# Altium integrated library Supernova Connectors.IntLib: 270 symbols (part 2 of 2)
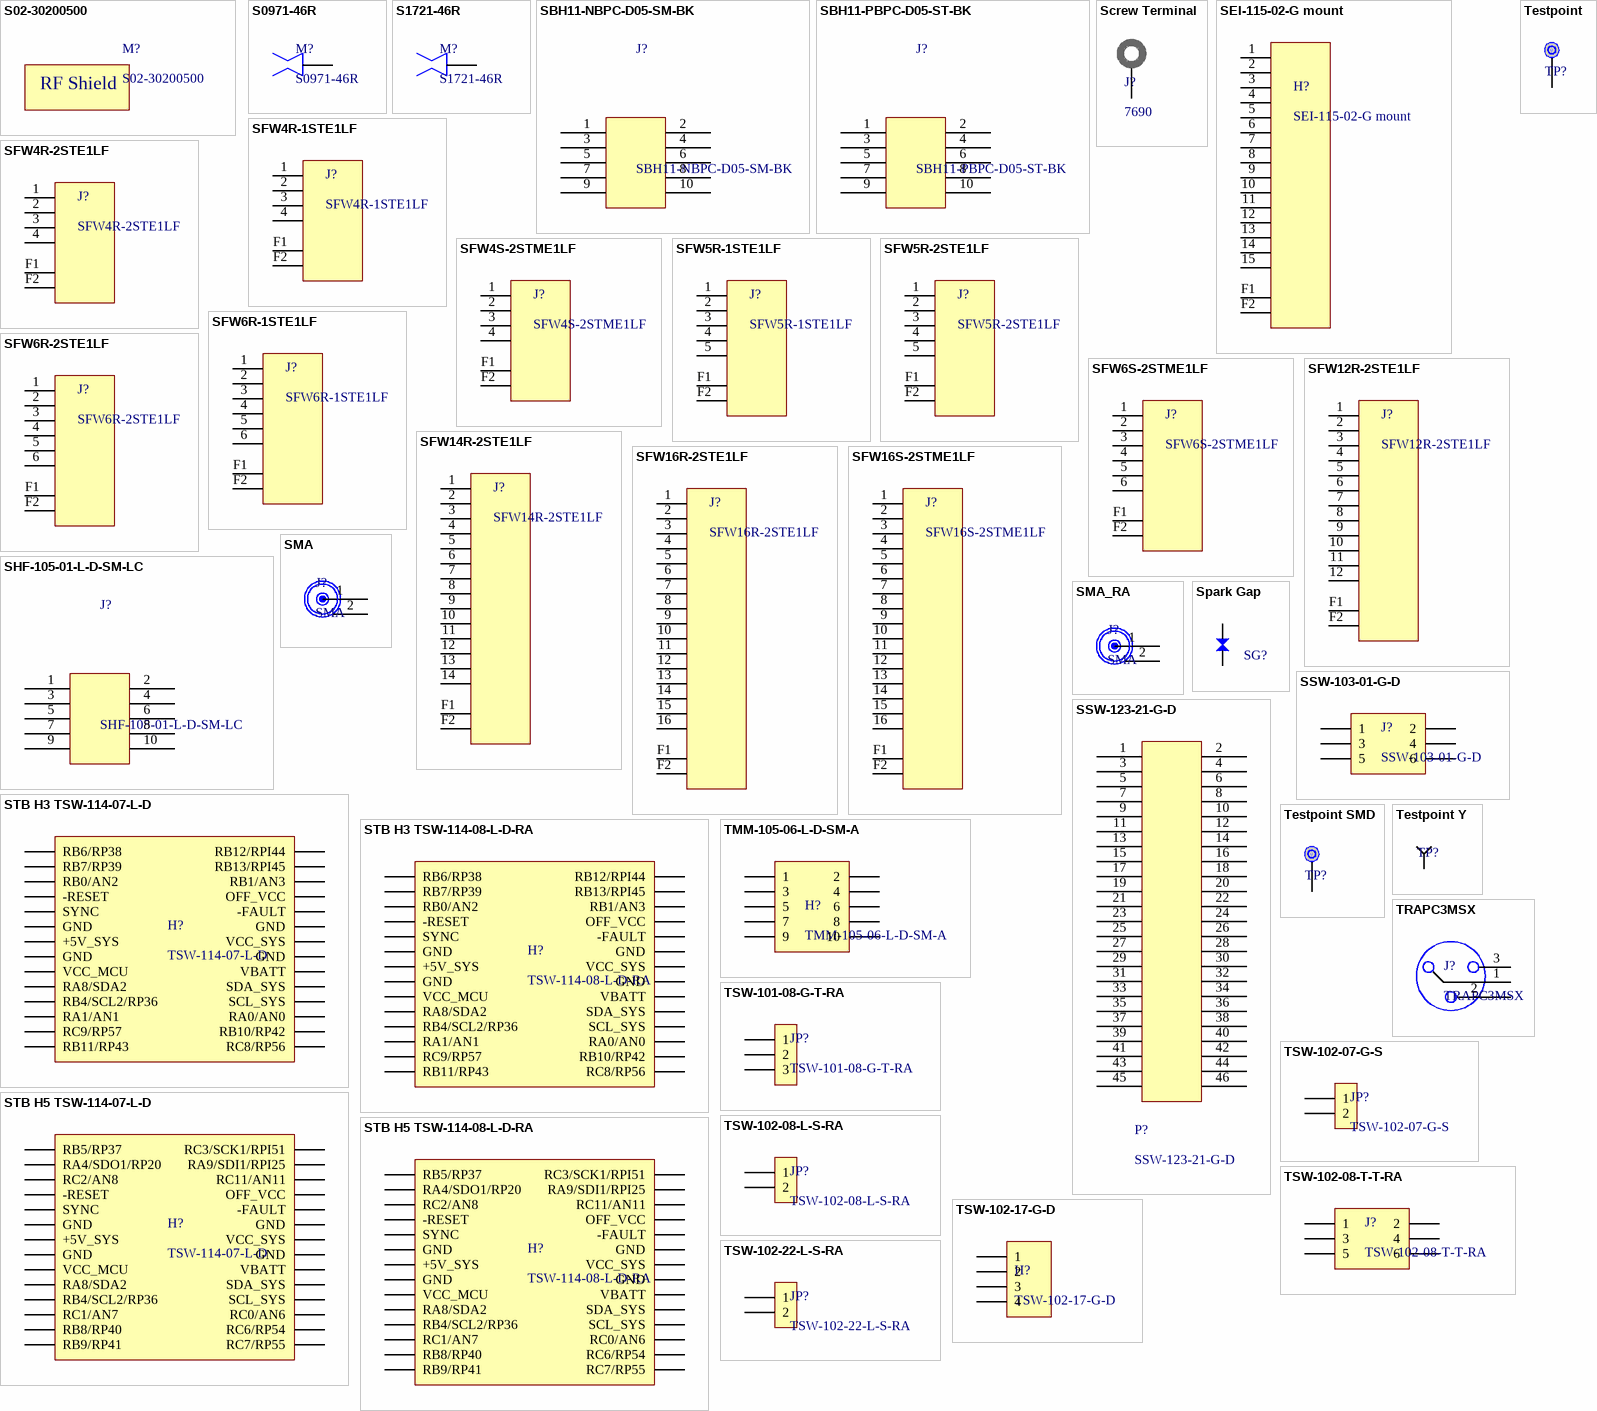
[diagram p9: symbols S02-30200500 to TSW-102-22-L-S-RA]

## SFW6S-2STME1LF
designator J?
Header Flex Connector 6 pin; vertical; Supplier 1: Digi-Key; Supplier 2: Mouser; Supplier Part Number 1: 609-1137-1-ND; Supplier Part Number 2: 649-SFW6S-2STME1LF; Supplier 3: Digi-Key; Supplier Part Number 3: 609-1136-1-ND; System: Connector
footprint SFW6S-2ST(M)E1LF
pins: 1, 2 1, 3 1, 4 1, 5 1, 6 1, F1 F, F2 F

## SFW12R-2STE1LF
designator J?
Header Flex Connector 12 pin; top side; Supplier 1: Digi-Key; Supplier Part Number 1: 609-1901-1-ND; System: Connector
footprint SFW12R-2STE1LF
pins: 1, 2 1, 3 1, 4 1, 5 1, 6 1, 7 1, 8 1, 9 1, 10 1, 11 1, 12 1, F1 F, F2 F

## SFW14R-2STE1LF
designator J?
Header Flex Connector 14 pin; top side; Supplier 1: Digi-Key; Supplier Part Number 1: 609-1903-1-ND; System: Connector
footprint SFW14R-2STE1LF
pins: 1, 2 1, 3 1, 4 1, 5 1, 6 1, 7 1, 8 1, 9 1, 10 1, 11 1, 12 1, 13 1, 14 1, F1 F, F2 F

## SFW16R-2STE1LF
designator J?
Header Flex Connector 16 pin; top side; Supplier 1: Digi-Key; Supplier Part Number 1: 609-1908-1-ND; System: Connector
footprint SFW16R-2STE1LF
pins: 1, 2 1, 3 1, 4 1, 5 1, 6 1, 7 1, 8 1, 9 1, 10 1, 11 1, 12 1, 13 1, 14 1, 15 1, 16 1, F1 F, F2 F

## SFW16S-2STME1LF
designator J?
Header Flex Connector 16 pin; vertical; Supplier 1: Mouser; Supplier 2: Mouser; Supplier Part Number 1: 649-SFW16S-2STME1LF; Supplier Part Number 2: 649-SFW16S-2STE1LF; System: Connector
footprint SFW16S-2ST(M)E1LF
pins: 1, 2 1, 3 1, 4 1, 5 1, 6 1, 7 1, 8 1, 9 1, 10 1, 11 1, 12 1, 13 1, 14 1, 15 1, 16 1, F1 F, F2 F

## SHF-105-01-L-D-SM-LC
designator J?
Header 10 pin micro JTAG; System: Connector; Supplier 1: Digi-Key; Supplier 2: Mouser; Supplier 3: Mouser; Supplier Part Number 1: SAM8855-ND; Supplier Part Number 2: 200-SHF10501LDSMLC; Supplier Part Number 3: 200-SHF10501LDSMLCTR
footprint SHF-105-01-L-D-SM-LC
pins: 1, 2, 3, 4, 5, 6, 7, 8, 9, 10

## SMA
designator J?
Header SMA Through-hole vertical; Supplier 1: Digi-Key; Supplier Part Number 1: SAM8971-ND; Supplier 2: Digi-Key; Supplier Part Number 2: WM5544-ND
footprint SMA
pins: 1 7, 2 7

## SMA_RA
designator J?, comment SMA
Header SMA Through-hole RA; Supplier 1: Mouser; Supplier 2: Digi-Key; Supplier Part Number 1: 538-73391-0083; Supplier Part Number 2: WM26450-ND
footprint SMA - RA
pins: 1 7, 2 7

## Spark Gap
designator SG?  (value not drawn)  (no BOM)
Spark Gap
footprint Spark_Gap
pins: 1, 2

## SSW-103-01-G-D
designator J?
Header 2x3 TH female; System: Connector; Supplier 1: Digi-Key; Supplier Part Number 1: SAM1208-03-ND; Supplier 2: Newark; Supplier Part Number 2: 15P2872
footprint SSW-103-01-G-D
pins: 1, 2, 3, 4, 5, 6

## SSW-123-21-G-D
designator P?
Header 46-pin double row TH; System: Connector; Supplier 1: Mouser; Supplier 2: Digi-Key; Supplier Part Number 1: 200-SSW12321GD; Supplier Part Number 2: SSW-123-21-G-D-ND
footprint SSW-123-21-G-D (SSW-123-21-G-D Samtech 46-pin connector)
pins: 1, 2, 3, 4, 5, 6, 7, 8, 9, 10, 11, 12, 13, 14, 15, 16, 17, 18, 19, 20, 21, 22, 23, 24, 25, 26, 27, 28, 29, 30, 31, 32, 33, 34, 35, 36, 37, 38, 39, 40, 41, 42, 43, 44, 45, 46

## STB H3 TSW-114-07-L-D
designator H?, comment TSW-114-07-L-D
STB Breakout Connector TH Vertical; Supplier 1: Digi-Key; Supplier Part Number 1: SAM1030-14-ND; Supplier 2: Newark; Supplier 3: Digi-Key; Supplier Part Number 2: 12P2069; Supplier Part Number 3: HTSW-114-07-L-D-ND; System: Connector
footprint TSW-114-07-L-D
pins: 1 RB6/RP38, 2 RB12/RPI44, 3 RB7/RP39, 4 RB13/RPI45, 5 RB0/AN2, 6 RB1/AN3, 7 -RESET, 8 OFF_VCC, 9 SYNC, 10 -FAULT, 11 GND, 12 GND, 13 +5V_SYS, 14 VCC_SYS, 15 GND, 16 GND, 17 VCC_MCU, 18 VBATT, 19 RA8/SDA2, 20 SDA_SYS, 21 RB4/SCL2/RP36, 22 SCL_SYS, 23 RA1/AN1, 24 RA0/AN0, 25 RC9/RP57, 26 RB10/RP42, 27 RB11/RP43, 28 RC8/RP56

## STB H3 TSW-114-08-L-D-RA
designator H?, comment TSW-114-08-L-D-RA
STB Breakout Connector TH RA; Supplier 1: Digi-Key; Supplier 2: Digi-Key; Supplier Part Number 1: HTSW-114-08-L-D-RA-ND; Supplier Part Number 2: SAM1041-14-ND; System: Connector
footprint TSW-114-08-L-D-RA (TSW-114-07-L-D)
pins: 1 RB6/RP38, 2 RB12/RPI44, 3 RB7/RP39, 4 RB13/RPI45, 5 RB0/AN2, 6 RB1/AN3, 7 -RESET, 8 OFF_VCC, 9 SYNC, 10 -FAULT, 11 GND, 12 GND, 13 +5V_SYS, 14 VCC_SYS, 15 GND, 16 GND, 17 VCC_MCU, 18 VBATT, 19 RA8/SDA2, 20 SDA_SYS, 21 RB4/SCL2/RP36, 22 SCL_SYS, 23 RA1/AN1, 24 RA0/AN0, 25 RC9/RP57, 26 RB10/RP42, 27 RB11/RP43, 28 RC8/RP56

## STB H5 TSW-114-07-L-D
designator H?, comment TSW-114-07-L-D
STB Breakout Connector TH Vertical; Supplier 1: Digi-Key; Supplier Part Number 1: SAM1030-14-ND; Supplier 2: Newark; Supplier 3: Digi-Key; Supplier Part Number 2: 12P2069; Supplier Part Number 3: HTSW-114-07-L-D-ND; System: Connector
footprint TSW-114-07-L-D
pins: 1 RB5/RP37, 2 RC3/SCK1/RPI51, 3 RA4/SDO1/RP20, 4 RA9/SDI1/RPI25, 5 RC2/AN8, 6 RC11/AN11, 7 -RESET, 8 OFF_VCC, 9 SYNC, 10 -FAULT, 11 GND, 12 GND, 13 +5V_SYS, 14 VCC_SYS, 15 GND, 16 GND, 17 VCC_MCU, 18 VBATT, 19 RA8/SDA2, 20 SDA_SYS, 21 RB4/SCL2/RP36, 22 SCL_SYS, 23 RC1/AN7, 24 RC0/AN6, 25 RB8/RP40, 26 RC6/RP54, 27 RB9/RP41, 28 RC7/RP55

## STB H5 TSW-114-08-L-D-RA
designator H?, comment TSW-114-08-L-D-RA
STB Breakout Connector TH RA; Supplier 1: Digi-Key; Supplier 2: Digi-Key; Supplier Part Number 1: HTSW-114-08-L-D-RA-ND; Supplier Part Number 2: SAM1041-14-ND; System: Connector
footprint TSW-114-08-L-D-RA (TSW-114-07-L-D)
pins: 1 RB5/RP37, 2 RC3/SCK1/RPI51, 3 RA4/SDO1/RP20, 4 RA9/SDI1/RPI25, 5 RC2/AN8, 6 RC11/AN11, 7 -RESET, 8 OFF_VCC, 9 SYNC, 10 -FAULT, 11 GND, 12 GND, 13 +5V_SYS, 14 VCC_SYS, 15 GND, 16 GND, 17 VCC_MCU, 18 VBATT, 19 RA8/SDA2, 20 SDA_SYS, 21 RB4/SCL2/RP36, 22 SCL_SYS, 23 RC1/AN7, 24 RC0/AN6, 25 RB8/RP40, 26 RC6/RP54, 27 RB9/RP41, 28 RC7/RP55

## Testpoint
designator TP?  (value not drawn)  (no BOM)
Testpoint; Supplier 1: Digi-Key; Supplier 2: Digi-Key; Supplier Part Number 1: 36-5002-ND; Supplier Part Number 2: 36-5001-ND
footprint Testpoint
footprint TH PAD
footprint GND Testpoint
pins: 1

## Testpoint SMD
designator TP?  (value not drawn)  (no BOM)
Testpoint SMD
footprint Testpoint - SMD
footprint Testpoint - SMD - SM Defined
pins: 1

## Testpoint Y
designator TP?  (value not drawn)  (no BOM)
Testpoint
footprint Testpoint
footprint TH PAD
pins: 1

## TMM-105-06-L-D-SM-A
designator H?
Header 5x2 SMD 2mm pitch; System: Connector; Supplier 1: Digi-Key; Supplier Part Number 1: SAM12979-ND; Supplier 2: Digi-Key; Supplier 3: Digi-Key; Supplier 4: Digi-Key; Supplier 5: Digi-Key; Supplier 6: Digi-Key; Supplier Part Number 2: TMM-105-06-L-D-SM-A-P-ND; Supplier Part Number 3: TMM-105-06-S-D-SM-A-ND; Supplier Part Number 4: TMM-105-06-S-D-SM-A-P-ND; Supplier Part Number 5: TMM-105-06-G-D-SM-A-P-ND; Supplier Part Number 6: TMM-105-06-G-D-SM-A-ND
footprint TMM-105-06-G-D-SM
pins: 1, 2, 3, 4, 5, 6, 7, 8, 9, 10

## TRAPC3MSX
designator J?
Header Circular 3 pin; Supplier 1: Digi-Key; Supplier Part Number 1: SC2005-ND; Supplier 2: Mouser; Supplier Part Number 2: 502-TRAPC3MSX
footprint TRAPC3MSX
pins: 1, 2, 3

## TSW-101-08-G-T-RA
designator JP?
Header 3x1 TH RA; System: Connector; Supplier 1: Digi-Key; Supplier 2: Digi-Key; Supplier Part Number 1: SAM12297-ND; Supplier Part Number 2: SAM15939-ND
footprint 3x1 0.100" header RA
pins: 1, 2, 3

## TSW-102-07-G-S
designator JP?
Header 2x1 TH; System: Connector; Mass_g: 0.03564; Supplier 1: Digi-Key; Supplier Part Number 1: SAM1029-02-ND; Supplier 2: Digi-Key; Supplier 3: Digi-Key; Supplier 4: Digi-Key; Supplier Part Number 2: SAM10844-ND; Supplier Part Number 3: SAM8920-ND; Supplier Part Number 4: SAM10532-ND
footprint HDV1X2HTH (Connector; Header; 2 Position; Vertical. Through hole)
pins: 1, 2

## TSW-102-08-L-S-RA
designator JP?
Header 2x1 RA TH; System: Connector; Supplier 1: Digi-Key; Supplier Part Number 1: SAM1043-02-ND; Supplier 2: Digi-Key; Supplier 3: Digi-Key; Supplier 4: Digi-Key; Supplier Part Number 2: SAM10325-ND; Supplier Part Number 3: HTSW-102-08-G-S-RA-ND; Supplier Part Number 4: SAM1039-02-ND
footprint HDR1X2HTH (Connector; Header; 3 Position; Right Angle. Through hole)
pins: 1, 2

## TSW-102-08-T-T-RA
designator J?
Header 3x2 TH RA; System: Connector; Supplier 1: Digi-Key; Supplier Part Number 1: TSW-102-08-T-T-RA-ND; Supplier 2: Avnet; Supplier Part Number 2: TSW-102-08-T-T-RA
footprint 3x2 0.100" header RA
pins: 1, 2, 3, 4, 5, 6

## TSW-102-17-G-D
designator H?
Header 4 Pin TSW; System: Connector; Supplier 1: Digi-Key; Supplier Part Number 1: SAM1060-02-ND; Supplier 2: Digi-Key; Supplier 3: Newark; Supplier Part Number 2: HTSW-102-17-G-D-ND; Supplier Part Number 3: 12P1284
footprint TSW-102-17-G-D
pins: 1, 2, 3, 4

## TSW-102-22-L-S-RA
designator JP?
Header 2x1 RA TH raised; System: Connector; Supplier 1: Digi-Key; Supplier Part Number 1: TSW-102-22-L-S-RA-ND; Supplier 2: Digi-Key; Supplier 3: Newark; Supplier Part Number 2: HTSW-102-22-L-S-RA-ND; Supplier Part Number 3: 79P3649
footprint TSW-102-22-L-S-RA (Connector; Header; 3 Position; Right Angle. Through hole)
pins: 1, 2

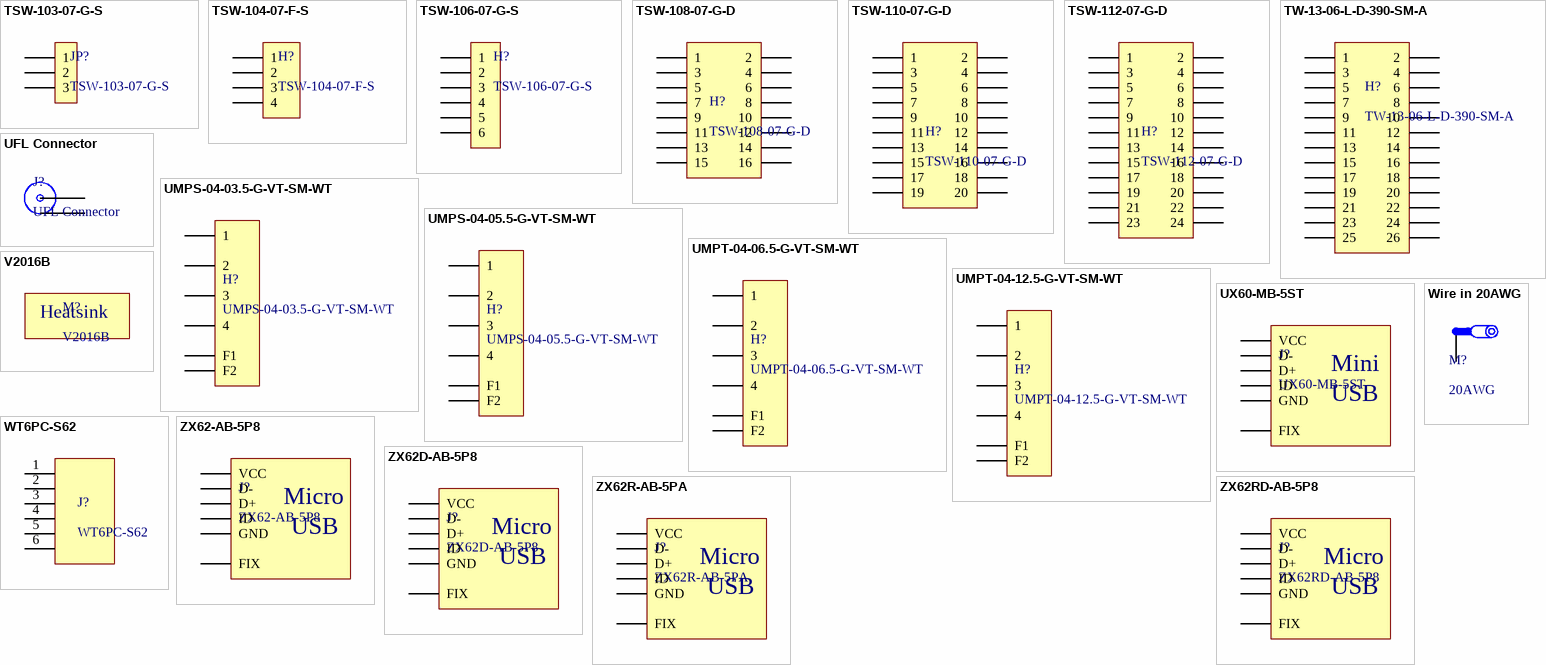
[diagram p8: symbols TSW-103-07-G-S to ZX62RD-AB-5P8]

## TSW-103-07-G-S
designator JP?
Header 3x1 TH; System: Connector; Mass_g: 0.15; Supplier 1: Digi-Key; Supplier Part Number 1: SAM1029-03-ND; Supplier 2: Digi-Key; Supplier 3: Digi-Key; Supplier 4: Digi-Key; Supplier Part Number 2: SAM8814-ND; Supplier Part Number 3: SAM8922-ND; Supplier Part Number 4: SAM1031-03-ND
footprint 3x1 0.100" header
footprint 3x1 0.100" header - No Silk
pins: 1, 2, 3

## TSW-104-07-F-S
designator H?
Header 4x1 TH; System: Connector; Supplier 1: Digi-Key; Supplier 2: Digi-Key; Supplier Part Number 1: SAM1031-04-ND; Supplier Part Number 2: 609-3255-ND
footprint 4 pin TH header
pins: 1, 2, 3, 4

## TSW-106-07-G-S
designator H?
Header 6x1 TH; System: Connector; Supplier 1: Digi-Key; Supplier Part Number 1: SAM1029-06-ND; Supplier 2: Digi-Key; Supplier 3: Digi-Key; Supplier 4: Digi-Key; Supplier Part Number 2: SAM10539-ND; Supplier Part Number 3: SAM1031-06-ND; Supplier Part Number 4: HTSW-106-07-L-S-ND
footprint 6x1 0.100" header
pins: 1, 2, 3, 4, 5, 6

## TSW-108-07-G-D
designator H?
Header 8x2 Pin; System: Connector*; Supplier 1: Digi-Key; Supplier Part Number 1: SAM1028-08-ND; Supplier 2: Digi-Key; Supplier Part Number 2: SAM10540-ND
footprint TSW-108-07-G-D (ESQ-126-37-G-D Samtech 52-pin connector)
pins: 1, 2, 3, 4, 5, 6, 7, 8, 9, 10, 11, 12, 13, 14, 15, 16

## TSW-110-07-G-D
designator H?
Header 10x2 Pin; System: Connector; Supplier 1: Digi-Key; Supplier Part Number 1: SAM1028-10-ND; Supplier 2: Mouser; Supplier Part Number 2: 200-TSW11007GD
footprint TSW-110-07-G-D
pins: 1, 2, 3, 4, 5, 6, 7, 8, 9, 10, 11, 12, 13, 14, 15, 16, 17, 18, 19, 20

## TSW-112-07-G-D
designator H?
Header 12x2 Pin; System: Connector; Mass_g: 0.42768; Supplier 1: Digi-Key; Supplier Part Number 1: SAM1028-12-ND; Supplier 2: Digi-Key; Supplier Part Number 2: HTSW-112-07-G-D-ND
footprint TSW-112-07-G-D (ESQ-126-37-G-D Samtech 52-pin connector)
pins: 1, 2, 3, 4, 5, 6, 7, 8, 9, 10, 11, 12, 13, 14, 15, 16, 17, 18, 19, 20, 21, 22, 23, 24

## TW-13-06-L-D-390-SM-A
designator H?
Header 13x2 TH 2mm pitch; System: Connector; Supplier 1: Newark; Supplier Part Number 1: 73X0656; Supplier 2: Newark; Supplier Part Number 2: 73X0584
footprint TW-13-06-X-D-390-SM-A
pins: 1, 2, 3, 4, 5, 6, 7, 8, 9, 10, 11, 12, 13, 14, 15, 16, 17, 18, 19, 20, 21, 22, 23, 24, 25, 26

## UFL Connector
designator J?
Mass_g: 0.15; Supplier 1: Digi-Key; Supplier 2: Digi-Key; Supplier 3: Digi-Key; Supplier Part Number 1: 931-1107-1-ND; Supplier Part Number 2: H11891CT-ND; Supplier Part Number 3: H9161CT-ND
footprint UFL Connector
footprint UFL Connector - HV
pins: 1 2, 2 3

## UMPS-04-03.5-G-VT-SM-WT
designator H?
Header 4 Pin UMPS 3.5mm; System: Connector; Supplier 1: Digi-Key; Supplier 2: Mouser; Supplier Part Number 1: SAM16067CT-ND; Supplier Part Number 2: 200-UMPS43.5GVTSMWTK
footprint UMPS-04-03.5-G-VT-SM-WT
pins: 1, 2, 3, 4, F1, F2

## UMPS-04-05.5-G-VT-SM-WT
designator H?
Header 4 Pin UMPS 5.5mm; System: Connector; Supplier 1: Digi-Key; Supplier 2: Mouser; Supplier Part Number 1: SAM16071CT-ND; Supplier Part Number 2: 200-UMPS45.5GVTSMWTK
footprint UMPS-04-05.5-G-VT-SM-WT
pins: 1, 2, 3, 4, F1, F2

## UMPT-04-06.5-G-VT-SM-WT
designator H?
Header 4 Pin UMPT 6.5mm; System: Connector; Supplier 1: Digi-Key; Supplier 2: Mouser; Supplier Part Number 1: SAM16063CT-ND; Supplier Part Number 2: 200-UMPT46.5GVTSMWTK
footprint UMPT-04-06.5-G-VT-SM-WT
pins: 1, 2, 3, 4, F1, F2

## UMPT-04-12.5-G-VT-SM-WT
designator H?
Header 4 Pin UMPT 12.5mm; System: Connector
footprint UMPT-04-12.5-G-VT-SM-WT
pins: 1, 2, 3, 4, F1, F2

## UX60-MB-5ST
designator J?
Header USB Mini B; Supplier 1: Digi-Key; Supplier Part Number 1: H2959CT-ND; Supplier 2: Digi-Key; Supplier Part Number 2: H2961CT-ND
footprint USB Mini B
pins: 1 VCC, 2 D-, 3 D+, 4 ID, 5 GND, F FIX
text: Mini; USB

## V2016B
designator M?
Heatsink 8.5mmx8.5mm; Supplier 1: Digi-Key; Supplier Part Number 1: AE11388-ND
footprint V2016B
text: Heatsink

## Wire in 20AWG
designator M?, comment 20AWG
Wire to board, 20AWG
footprint 20 AWG Hole
pins: 1

## WT6PC-S62
designator J?
Connector AirBorn W series 6 pin
pins: 1, 2, 3 1, 4 1, 5 1, 6 1

## ZX62-AB-5P8
designator J?
Header USB Micro AB bottom side SMD; Supplier 1: Digi-Key; Supplier 2: Mouser; Supplier 3: Digi-Key; Supplier 4: Digi-Key; Supplier 5: Digi-Key; Supplier Part Number 1: H125279CT-ND; Supplier Part Number 3: H11635CT-ND; Supplier Part Number 2: 798-ZX62-AB-5PA31; Supplier Part Number 4: A97799CT-ND; Supplier Part Number 5: 455-2885-1-ND
footprint ZX62-AB-5P
pins: 1 VCC, 2 D-, 3 D+, 4 ID, 5 GND, F FIX
text: Micro; USB

## ZX62D-AB-5P8
designator J?
Header USB Micro AB bottom side; Supplier 1: Digi-Key; Supplier 2: Digi-Key; Supplier 3: Mouser; Supplier 4: Digi-Key; Supplier 5: Digi-Key; Supplier 6: Digi-Key; Supplier Part Number 1: H11494CT-ND; Supplier Part Number 2: H125271CT-ND; Supplier Part Number 3: 798-ZX62D-AB-5P830; Supplier Part Number 4: WM17143CT-ND; Supplier Part Number 5: H125272CT-ND; Supplier Part Number 6: H125718CT-ND
footprint ZX62D-AB-5P
pins: 1 VCC, 2 D-, 3 D+, 4 ID, 5 GND, F FIX
text: Micro; USB

## ZX62R-AB-5PA
designator J?
Header USB Micro AB top side SMD; Supplier 1: Mouser; Supplier 2: Digi-Key; Supplier 3: Digi-Key; Supplier 4: Mouser; Supplier Part Number 1: 798-ZX62R-AB-5P30; Supplier Part Number 2: H124531CT-ND; Supplier Part Number 3: H125274CT-ND; Supplier Part Number 4: 798-ZX62R-B-5P30
footprint ZX62R-AB-5P
pins: 1 VCC, 2 D-, 3 D+, 4 ID, 5 GND, F FIX
text: Micro; USB

## ZX62RD-AB-5P8
designator J?
Header USB Micro AB top side; Supplier 1: Mouser; Supplier Part Number 1: 798-ZX62RD-AB-5P8; Supplier 2: Digi-Key; Supplier Part Number 2: H11611CT-ND; Supplier 3: Digi-Key; Supplier Part Number 3: H125777CT-ND; Supplier 4: Mouser; Supplier Part Number 4: 798-ZX62RD-AB-5P830; Supplier 5: Digi-Key; Supplier Part Number 5: WM17144CT-ND
footprint ZX62RD-AB-5P
pins: 1 VCC, 2 D-, 3 D+, 4 ID, 5 GND, F FIX
text: Micro; USB